# Altium footprint library THU VIEN V1.PcbLib: 400 footprints (part 14 of 25)
Each footprint in its own frame and in the unit in brackets; x right, y up, seen from the top. Pads: shape width x height; smd on the part's side, far side on the other; paste and mask are expansions set on the pad; w line width, h text height; cw(c..) or ccw(c..) is an arc to the next point about the centre after c.
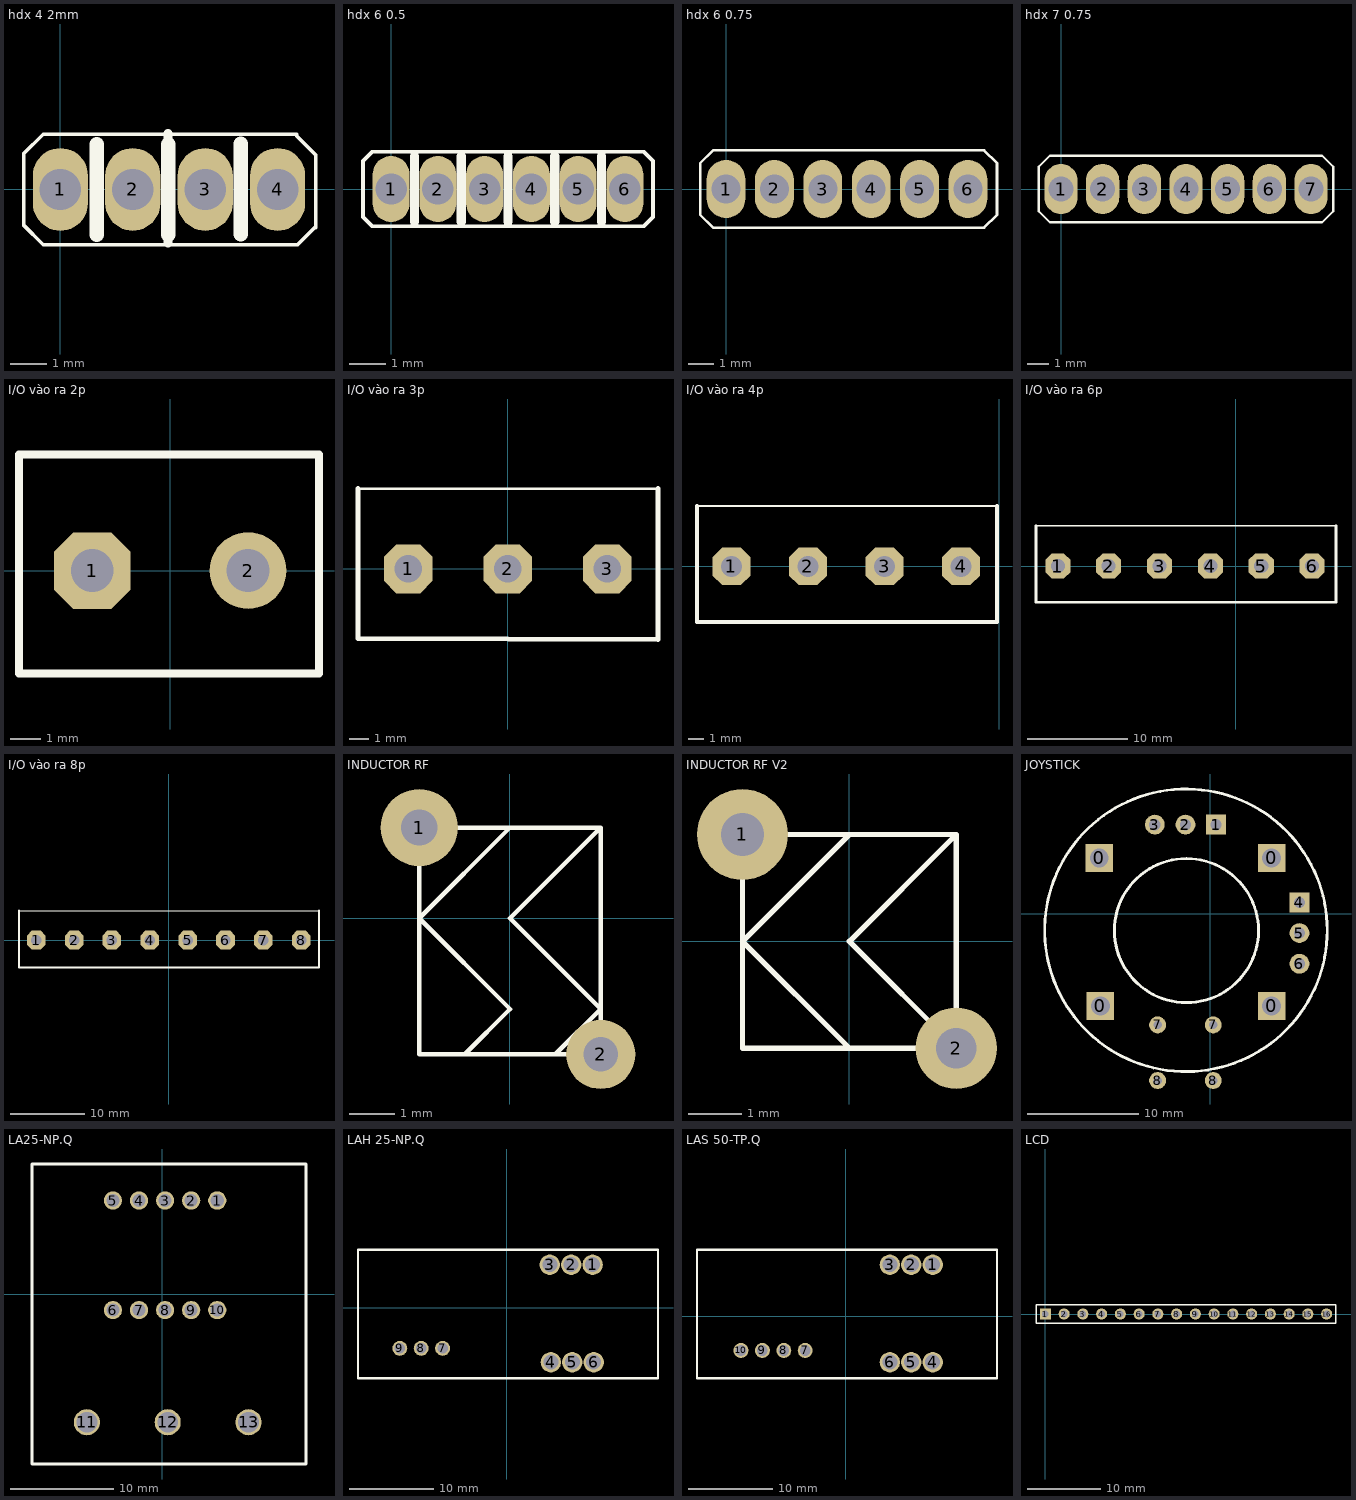
[diagram p13: the footprints below, top view; thin cyan lines are the x and y axes]

## hdx 4 2mm [mil]
pads (4):
  oval 60x90 hole 45: 1(0,0) 2(78.74,0) 3(157.48,0) 4(236.22,0)
Top Overlay:
  lines w3.94: -40,-38.74 -18.74,-60 257.87,-60 276.54,-41.34 277.56,-41.34 277.56,37.4 256.89,58.07 256.89,60 -18.74,60 -40,38.74 -40,-38.74
  lines w10: 117.13,-58.07 117.13,60.98
  lines w15.75: 39.37,-49.21 39.37,49.21 ; 117.48,-49.21 117.48,49.21 ; 196.22,-48.74 196.22,49.69

## hdx 6 0.5 [mm]
pads (6):
  oval 1x1.8 hole 0.85: 1(0,0) 2(1.27,0) 3(2.54,0) 4(3.81,0) 5(5.08,0) 6(6.35,0)
Top Overlay:
  lines w0.1: -0.762,-0.762 -0.762,0.762 -0.508,1.016 6.858,1.016 7.112,0.762 7.112,-0.762 6.858,-1.016 -0.508,-1.016 -0.762,-0.762
  lines w0.254: 0.635,-0.889 0.635,0.889 ; 1.905,-0.889 1.905,0.889 ; 3.175,-0.889 3.175,0.889 ; 4.445,-0.889 4.445,0.889 ; 5.715,-0.889 5.715,0.889

## hdx 6 0.75 [mil]
pads (6):
  oval 60x90 hole 45: 1(0,0) 2(75,0) 3(150,0) 4(225,0) 5(300,0) 6(375,0)
Top Overlay:
  lines w3.94: -40,-40 -40,40 -20,60 400,60 420,40 420,-40 400,-60 -20,-60 -40,-40

## hdx 7 0.75 [mil]
pads (7):
  oval 60x90 hole 45: 1(0,0) 2(75,0) 3(150,0) 4(225,0) 5(300,0) 6(375,0) 7(450,0)
Top Overlay:
  lines w3.94: -40,-40 -40,40 -20,60 470,60 490,40 490,-40 470,-60 -20,-60 -40,-40

## I/O vào ra 2p [mm]
pads (2):
  oct 2.5x2.5 hole 1.397: 1(-2.54,0)
  round 2.5 hole 1.397: 2(2.54,0)
Top Overlay:
  lines w0.254: -4.928,-3.353 -4.928,3.785 4.851,3.785 4.851,-3.353 -4.928,-3.353
3D body: height 10, standoff -4, extent -5.055,-3.505 4.945,3.995

## I/O vào ra 3p [mm] "hkgvh"
pads (3):
  oct 2.5x2.5 hole 1.4: 1(-5.08,0) 2(0,0) 3(5.08,0)
Top Overlay:
  lines w0.15: -7.645,4.089 7.671,4.089
  lines w0.254: -7.645,4.089 -7.645,-3.548 7.671,-3.596 7.671,4.089
3D body: height 10, standoff -4, extent -7.475,-3.436 7.525,4.064

## I/O vào ra 4p [mm] "hkgvh"
pads (4):
  oct 2.5x2.5 hole 1.4: 1(-17.78,0) 2(-12.7,0) 3(-7.62,0) 4(-2.54,0)
Top Overlay:
  lines w0.15: -20.066,4.013 -0.152,4.013
  lines w0.254: -20.066,4.013 -20.066,0.86 -20.066,-0.111 -20.066,-1.206 -20.066,-3.697 -0.279,-3.697 -0.279,-3.683 -0.152,-3.683 -0.152,4.013
3D body: height 10, standoff -4, extent -10.156,-3.531 -0.156,3.969
3D body: height 10, standoff -4, extent -20.033,-3.531 -10.033,3.969

## I/O vào ra 6p [mm] "hkgvh"
pads (6):
  oct 2.5x2.5 hole 1.4: 1(-17.78,0) 2(-12.7,0) 3(-7.62,0) 4(-2.54,0) 5(2.54,0) 6(7.62,0)
Top Overlay:
  lines w0.15: -19.964,4.013 10.008,4.013
  lines w0.254: -19.964,4.013 -19.964,-3.607 10.008,-3.607 10.008,4.013
3D body: height 10, standoff -4, extent -0.127,-3.538 9.873,3.962
3D body: height 10, standoff -4, extent -10.004,-3.538 -0.004,3.962
3D body: height 10, standoff -4, extent -19.881,-3.563 -9.881,3.937

## I/O vào ra 8p [mm] "hkgvh"
pads (8):
  oct 2.5x2.5 hole 1.4: 1(-17.78,0) 2(-12.7,0) 3(-7.62,0) 4(-2.54,0) 5(2.54,0) 6(7.62,0) 7(12.7,0) 8(17.78,0)
Top Overlay:
  lines w0.15: -20.091,3.962 20.168,3.962
  lines w0.254: -20.091,3.962 -20.091,-3.683 20.168,-3.683 20.168,3.962
3D body: height 10, standoff -4, extent 9.884,-3.588 19.884,3.912
3D body: height 10, standoff -4, extent -0.047,-3.588 9.953,3.912
3D body: height 10, standoff -4, extent -9.978,-3.512 0.022,3.988
3D body: height 10, standoff -4, extent -19.884,-3.563 -9.884,3.937

## INDUCTOR RF [mm]
pads (2):
  round 1.7 hole 0.8: 1(-2,2)
  round 1.524 hole 0.762: 2(2,-3)
Top Overlay:
  lines w0.1: -1,-3 0,-2 ; 1,-3 2,-2 ; 0,-2 -2,0 0,2 2,2 ; 0,-2 0,-2 ; 2,-2 0,0 2,2 ; 2,-2 2,-2 ; 2,2 -2,2 -2,-3 2,-3 2,2

## INDUCTOR RF V2 [mm]
pads (2):
  round 1.7 hole 0.8: 1(-2,2)
  round 1.524 hole 0.762: 2(2,-2)
Top Overlay:
  lines w0.1: 0,-2 0,-2 ; 0,-2 -2,0 0,2 2,2 ; 2,-2 2,-2 ; 2,-2 0,0 2,2 ; 2,-2 2,2 ; 2,-2 -2,-2 -2,2 2,2

## JOYSTICK [mm]
pads (14):
  rect 2.5x2.5 hole 1.7: 0(-10,5) 0(-9.9,-8.3) 0(5.5,-8.3) 0(5.5,5)
  rect 1.778x1.778 hole 1.016: 1(0.5,8) 4(8,1)
  round 1.778 hole 1.016: 2(-2.25,8) 3(-5,8) 5(8,-1.75) 6(8,-4.5)
  round 1.524 hole 0.762: 7(-4.75,-10) 7(0.25,-10) 8(-4.75,-15) 8(0.25,-15)
Top Overlay:
  circle w0.254: c-2.2,-1.5 r12.7
  circle w0.254: c-2.158,-1.524 r6.476
3D body: height 1.98, standoff -29.62, extent -15.108,-16.566 11.191,11.645

## LA25-NP.Q [mil]
pads (13):
  round 70 hole 50: 1(210,360) 2(110,360) 3(10,360) 4(-90,360) 5(-190,360) 6(-190,-60) 7(-90,-60) 8(10,-60) 9(110,-60) 10(210,-60)
  round 100 hole 80: 11(-290,-490) 12(20,-490) 13(330,-490)
Top Overlay:
  lines w10: -500,-650 -500,-500 -500,500 -237.5,500 287.5,500 550,500 550,-650 -500,-650

## LAH 25-NP.Q [mil]
pads (9):
  round 95 hole 70: 1(400,200) 2(300,200) 3(200,200) 4(205,-255) 5(305,-255) 6(405,-255)
  round 70 hole 50: 7(-300,-190) 8(-400,-190) 9(-500,-190)
Top Overlay:
  lines w10: -695,-330 -195,-330 705,-330 705,270 -195,270 -695,270 -695,-330

## LAS 50-TP.Q [mil]
pads (10):
  round 95 hole 70: 1(405,240) 2(305,240) 3(205,240) 4(405,-215) 5(305,-215) 6(205,-215)
  round 70 hole 50: 7(-190,-160) 8(-290,-160) 9(-390,-160) 10(-490,-160)
Top Overlay:
  lines w10: -695,-290 -195,-290 705,-290 705,310 -195,310 -695,310 -695,-290

## LCD [mm] "Connector; Header; 16 Position"
pads (16):
  rect 1.5x1.5 hole 0.9: 1(0,0)
  round 1.5 hole 0.9: 2(2.54,0) 3(5.08,0) 4(7.62,0) 5(10.16,0) 6(12.7,0) 7(15.24,0) 8(17.78,0) 9(20.32,0) 10(22.86,0) 11(25.4,0) 12(27.94,0) 13(30.48,0) 14(33.02,0) 15(35.56,0) 16(38.1,0)
Top Overlay:
  lines w0.2: -1.27,-1.27 39.37,-1.27 39.37,1.27 0.635,1.27 -1.27,1.27 -1.27,-1.27
3D body: height 12.65, standoff 3.05, extent -15.672,-35.153 100.406,2.184
3D body: height 6.02, standoff -3.1, extent 29.185,-1.27 39.345,1.27
3D body: height 6.02, standoff -3.1, extent 19.05,-1.27 29.21,1.27
3D body: height 6.02, standoff -3.1, extent 8.89,-1.27 19.05,1.27
3D body: height 6.02, standoff -3.1, extent -1.219,-1.27 8.941,1.27